# Altium schematic symbol library Electronic Devices_LIB.SchLib: 703 symbols (part 5 of 8)
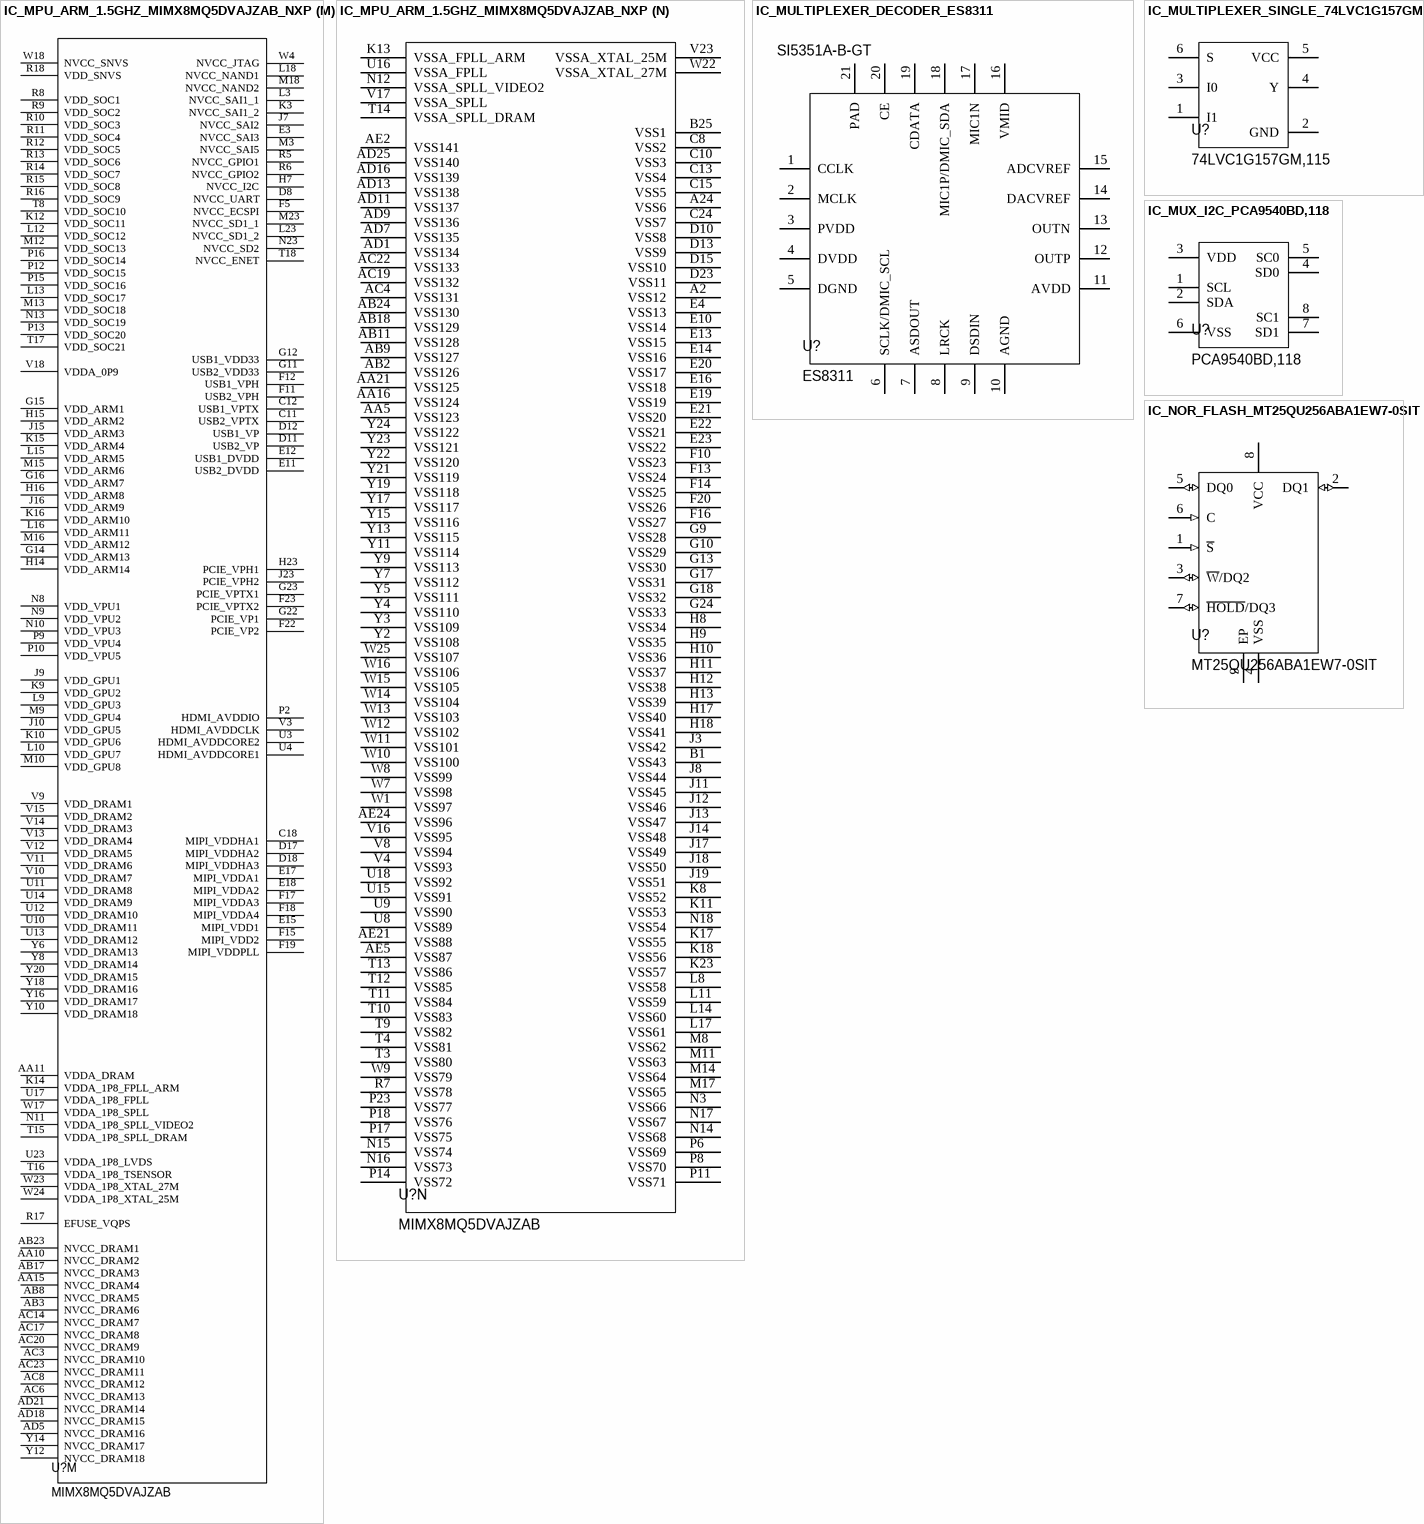
[diagram p40: symbols IC_MPU_ARM_1.5GHZ_MIMX8MQ5DVAJZAB_NXP to IC_NOR_FLASH_MT25QU256ABA1EW7-0SIT]

## IC_MPU_ARM_1.5GHZ_MIMX8MQ5DVAJZAB_NXP
designator U?, comment MIMX8MQ5DVAJZAB
SOC i.MX 8M ARM Cortex A53/ARM Cortex M4 621-Pin FBGA Tray; Manufacturer: NXP Semiconductors; Supplier 1: Digi-Key; Manufacturer Part Number: MIMX8MQ5DVAJZAB; RoHS: Yes; Category: Microprocessors; Stock 1: 760; Pricing 1: 1=66.08, 10=53.977, 90=48.753 (USD); RoHS Compliant: Yes; Supplier Part Number 1: 568-14719-ND
footprint IC_MPU_BGA621C65P25X25_1700X1700X218 (621-FCPBGA (17x17))
part A pins: AA1 DRAM_DQ22, AA2 DRAM_DQ20, AA3 DRAM_DQ26, AA4 DRAM_DQ25, AA6 DRAM_DQ27, AA7 DRAM_DQ30, AA8 DRAM_DQ28, AA9 DRAM_DQ31, AA12 -- / PARITY / --, AA13 ZQ / ZQ / ZQ, AA14 VREF / VREF / VREF, AA17 DRAM_DQ15, AA18 DRAM_DQ12, AA19 DRAM_DQ14, AA20 DRAM_DQ11, AA22 DRAM_DQ09, AA23 DRAM_DQ10, AA24 DRAM_DQ04, AA25 DRAM_DQ06, AB1 DRAM_DQ23, AB4 DRAM_DQ24, AB5 DRAM_DQS3_P, AB6 DRAM_DM3, AB7 DRAM_DQ29, AB10 -- / RAS_n(A16) / RAS#, AB12 -- / BA1 / BA1, AB13 RESET_n / RESET_n / RESET#, AB14 MTEST / MTEST / MTEST, AB15 -- / A9 / A9, AB16 -- / A4 / A4, AB19 DRAM_DQ13, AB20 DRAM_DM1, AB21 DRAM_DQS1_P, AB22 DRAM_DQ08, AB25 DRAM_DQ07, AC1 DRAM_DQS2_N, AC2 DRAM_DQS2_P, AC5 DRAM_DQS3_N, AC7 CA2_B / A13 / A13, AC9 CS0_B / -- / --, AC10 -- / WE_n(A14) / WE#, AC11 -- / CS1_n / CS1#, AC12 -- / ODT0 / ODT0, AC13 MTEST1 / MTEST1(ALERT_n) / MTEST1, AC15 -- / A3 / A3, AC16 CKE0_A / CKE0 / CKE0, AC18 CS1_A / C0 / --, AC21 DRAM_DQS1_N, AC24 DRAM_DQS0_P, AC25 DRAM_DQS0_N, AD2 DRAM_DQ17, AD3 DRAM_DM2, AD4 DRAM_DQ19, AD6 CA5_B / A0 / A0, AD8 CS1_B / -- / --, AD10 CKE0_B / CK_t_B / CK_B, AD12 CK_t_B / A2 / A2, AD14 CK_t_A / BG0 / BA2, AD15 -- / CK_c_A / CK#_A, AD17 CA0_A / A12 / A12(BC#), AD19 CA4_A / A6 / A6, AD20 CA2_A / A7 / A7, AD22 DRAM_DQ03, AD23 DRAM_DM0, AD24 DRAM_DQ01, AE3 DRAM_DQ16, AE4 DRAM_DQ18, AE6 CA4_B / A10(AP) / A10(AP), AE7 CA3_B / BA0 / BA0, AE8 CA0_B / C2 / --, AE9 CA1_B / CAS_n(A15) / CAS#, AE10 CKE1_B / CK_c_B / CK#_B, AE11 -- / ODT1 / ODT1, AE12 CK_c_B / A1 / A1, AE13 -- / ACT_n / A15, AE14 CK_c_A / BG1 / A14, AE15 -- / CK_t_A / CK_A, AE16 CA1_A / A11 / A11, AE17 CKE1_A / CKE1 / CKE1, AE18 CS0_A / CS0_n / CS0#, AE19 CA5_A / A5 / A5, AE20 CA3_A / A8 / A8, AE22 DRAM_DQ02, AE23 DRAM_DQ00, Y1 DRAM_DQ21, Y25 DRAM_DQ05
part B pins: A8 USB2_RX_P, A9 USB2_TX_P, A10 USB2_DP, A11 USB1_RESREF, A12 USB1_RX_P, A13 USB1_TX_P, A14 USB1_DP, B8 USB2_RX_N, B9 USB2_TX_N, B10 USB2_DN, B11 USB2_RESREF, B12 USB1_RX_N, B13 USB1_TX_N, B14 USB1_DN, C9 USB2_ID, C14 USB1_ID, D9 USB2_VBUS, D14 USB1_VBUS
part C pins: C25 PCIE2_RESREF, D24 PCIE2_RXN_N, D25 PCIE2_RXN_P, E24 PCIE2_TXN_N, E25 PCIE2_TXN_P, F24 PCIE2_REF_PAD_CLK_N, F25 PCIE2_REF_PAD_CLK_P, G25 PCIE1_RESREF, H24 PCIE1_RXN_N, H25 PCIE1_RXN_P, J24 PCIE1_TXN_N, J25 PCIE1_TXN_P, K24 PCIE1_REF_PAD_CLK_N, K25 PCIE1_REF_PAD_CLK_P
part D pins: A15 MIPI_DSI_D3_N, A16 MIPI_DSI_D1_N, A17 MIPI_DSI_D0_N, A18 MIPI_DSI_D2_N, B15 MIPI_DSI_D3_P, B16 MIPI_DSI_D1_P, B17 MIPI_DSI_D0_P, B18 MIPI_DSI_D2_P, C16 MIPI_DSI_CLK_N, C17 MIPI_DSI_REXT, D16 MIPI_DSI_CLK_P
part E pins: A19 MIPI_CSI2_CLK_N, A20 MIPI_CSI2_D1_N, A21 MIPI_CSI2_D2_N, A22 MIPI_CSI1_CLK_N, A23 MIPI_CSI1_D0_N, B19 MIPI_CSI2_CLK_P, B20 MIPI_CSI2_D1_P, B21 MIPI_CSI2_D2_P, B22 MIPI_CSI1_CLK_P, B23 MIPI_CSI1_D0_P, B24 MIPI_CSI1_D2_N, C19 MIPI_CSI2_D3_N, C20 MIPI_CSI2_D0_N, C21 MIPI_CSI1_D3_N, C22 MIPI_CSI1_D1_N, C23 MIPI_CSI1_D2_P, D19 MIPI_CSI2_D3_P, D20 MIPI_CSI2_D0_P, D21 MIPI_CSI1_D3_P, D22 MIPI_CSI1_D1_P
part F pins: M1 HDMI_TX_P_LN_3, M2 HDMI_TX_M_LN_3, N1 HDMI_TX_M_LN_2, N2 HDMI_TX_P_LN_2, P1 HDMI_REXT, P3 HDMI_DDC_SDA, R1 HDMI_REFCLK_N, R2 HDMI_REFCLK_P, R3 HDMI_DDC_SCL, T1 HDMI_TX_P_LN_0, T2 HDMI_TX_M_LN_0, U1 HDMI_TX_M_LN_1, U2 HDMI_TX_P_LN_1, V1 HDMI_AUX_P, V2 HDMI_AUX_N, W2 HDMI_HPD, W3 HDMI_CEC
part G pins: A3 SAI1_MCLK, B2 SAI1_TXD2, B3 SAI1_TXD6, C1 SAI1_TXD7, C2 SAI1_TXD5, C3 SAI3_TXD, C4 SAI3_TXC, D1 SAI1_TXD3, D2 SAI1_TXD4, D3 SAI3_MCLK, E1 SAI1_TXC, E2 SAI1_TXD1, E6 SPDIF_EXT_CLK, F1 SAI1_RXD5, F2 SAI1_TXD0, F3 SAI3_RXD, F4 SAI3_RXC, F6 SPDIF_TX, G1 SAI1_RXD7, G2 SAI1_RXD6, G3 SAI3_TXFS, G4 SAI3_RXFS, G5 SAI2_TXD0, G6 SPDIF_RX, H1 SAI1_TXFS, H2 SAI1_RXD2, H3 SAI2_RXC, H4 SAI2_TXFS, H5 SAI2_MCLK, H6 SAI2_RXD0, J1 SAI1_RXD4, J2 SAI1_RXD3, J4 SAI2_RXFS, J5 SAI2_TXC, K1 SAI1_RXC, K2 SAI1_RXD0, K4 SAI5_MCLK, K5 SAI5_RXD3, L1 SAI1_RXFS, L2 SAI1_RXD1, L4 SAI5_RXD1, L5 SAI5_RXC, M4 SAI5_RXD2, M5 SAI5_RXD0, N4 SAI5_RXFS
part H pins: F21 NAND_CE2_B, G19 NAND_ALE, G20 NAND_DATA00, G21 NAND_CE1_B, H19 NAND_CE0_B, H20 NAND_CE3_B, H21 NAND_CLE, H22 NAND_DATA02, J20 NAND_DATA01, J21 NAND_DATA03, J22 NAND_DATA05, K19 NAND_RE_B, K20 NAND_READY_B, K21 NAND_WP_B, K22 NAND_WE_B, L19 NAND_DATA06, L20 NAND_DATA04, M19 NAND_DATA07, M20 NAND_DQS
part I pins: L21 SD2_CD_B, L22 SD2_CLK, L24 SD1_CMD, L25 SD1_CLK, M21 SD2_WP, M22 SD2_CMD, M24 SD1_DATA1, M25 SD1_DATA0, N21 SD2_DATA1, N22 SD2_DATA0, N24 SD1_DATA4, N25 SD1_DATA2, P21 SD2_DATA3, P22 SD2_DATA2, P24 SD1_DATA5, P25 SD1_DATA3, R22 SD2_RESET_B, R24 SD1_RESET_B, R25 SD1_DATA6, T24 SD1_STROBE, T25 SD1_DATA7
part J pins: N19 ENET_MDIO, N20 ENET_MDC, P19 ENET_TX_CTL, P20 ENET_TD3, R19 ENET_TD2, R20 ENET_TD0, R21 ENET_TD1, T19 ENET_TXC, T20 ENET_RXC, T21 ENET_RX_CTL, U19 ENET_RD0, U20 ENET_RD2, U21 ENET_RD1, V19 ENET_RD3
part K pins: A4 ECSPI1_MOSI, A5 ECSPI2_SS0, A6 UART3_RXD, A7 UART1_TXD, B4 ECSPI1_MISO, B5 ECSPI2_MISO, B6 UART2_RXD, B7 UART3_TXD, C5 ECSPI2_SCLK, C6 UART4_RXD, C7 UART1_RXD, D4 ECSPI1_SS0, D5 ECSPI1_SCLK, D6 UART2_TXD, D7 UART4_TXD, E5 ECSPI2_MOSI, E7 I2C1_SCL, E8 I2C1_SDA, E9 I2C3_SDA, F7 I2C2_SDA, F8 I2C4_SCL, F9 I2C4_SDA, G7 I2C2_SCL, G8 I2C3_SCL, J6 GPIO1_IO15, K6 GPIO1_IO13, K7 GPIO1_IO14, L6 GPIO1_IO11, L7 GPIO1_IO12, M6 GPIO1_IO09, M7 GPIO1_IO10, N5 GPIO1_IO06, N6 GPIO1_IO07, N7 GPIO1_IO08, P4 GPIO1_IO03, P5 GPIO1_IO04, P7 GPIO1_IO05, R4 GPIO1_IO02, T6 GPIO1_IO00, T7 GPIO1_IO01
part L pins: R23 CLK1_P, T5 JTAG_TCK, T22 CLK2_P, T23 CLK1_N, U5 JTAG_TDO, U6 JTAG_TRST_B, U7 JTAG_MOD, U22 CLK2_N, U24 XTALO_25M, U25 XTALI_25M, V5 JTAG_TMS, V6 BOOT_MODE1, V7 TEST_MODE, V20 PMIC_ON_REQ, V21 PMIC_STBY_REQ, V22 RTC, V24 XTALO_27M, V25 XTALI_27M, W5 JTAG_TDI, W6 BOOT_MODE0, W19 RTC_RESET_B, W20 POR_B, W21 ONOFF
part M pins: AA10 NVCC_DRAM2, AA11 VDDA_DRAM, AA15 NVCC_DRAM4, AB3 NVCC_DRAM6, AB8 NVCC_DRAM5, AB17 NVCC_DRAM3, AB23 NVCC_DRAM1, AC3 NVCC_DRAM10, AC6 NVCC_DRAM13, AC8 NVCC_DRAM12, AC14 NVCC_DRAM7, AC17 NVCC_DRAM8, AC20 NVCC_DRAM9, AC23 NVCC_DRAM11, AD5 NVCC_DRAM16, AD18 NVCC_DRAM15, AD21 NVCC_DRAM14, C11 USB2_VPTX, C12 USB1_VPTX, C18 MIPI_VDDHA1, D8 NVCC_UART, D11 USB2_VP, D12 USB1_VP, D17 MIPI_VDDHA2, D18 MIPI_VDDHA3, E3 NVCC_SAI3, E11 USB2_DVDD, E12 USB1_DVDD, E15 MIPI_VDD1, E17 MIPI_VDDA1, E18 MIPI_VDDA2, F5 NVCC_ECSPI, F11 USB2_VPH, F12 USB1_VPH, F15 MIPI_VDD2, F17 MIPI_VDDA3, F18 MIPI_VDDA4, F19 MIPI_VDDPLL, F22 PCIE_VP2, F23 PCIE_VPTX2, G11 USB2_VDD33, G12 USB1_VDD33, G14 VDD_ARM13, G15 VDD_ARM1, G16 VDD_ARM7, G22 PCIE_VP1, G23 PCIE_VPTX1, H7 NVCC_I2C, H14 VDD_ARM14, H15 VDD_ARM2, H16 VDD_ARM8, H23 PCIE_VPH1, J7 NVCC_SAI2, J9 VDD_GPU1, J10 VDD_GPU5, J15 VDD_ARM3, J16 VDD_ARM9, J23 PCIE_VPH2, K3 NVCC_SAI1_2, K9 VDD_GPU2, K10 VDD_GPU6, K12 VDD_SOC11, K14 VDDA_1P8_FPLL_ARM, K15 VDD_ARM4, K16 VDD_ARM10, L3 NVCC_SAI1_1, L9 VDD_GPU3, L10 VDD_GPU7, L12 VDD_SOC12, L13 VDD_SOC17, L15 VDD_ARM5, L16 VDD_ARM11, L18 NVCC_NAND1, L23 NVCC_SD1_2, M3 NVCC_SAI5, M9 VDD_GPU4, M10 VDD_GPU8, M12 VDD_SOC13, M13 VDD_SOC18, M15 VDD_ARM6, M16 VDD_ARM12, M18 NVCC_NAND2, M23 NVCC_SD1_1, N8 VDD_VPU1, N9 VDD_VPU2, N10 VDD_VPU3, N11 VDDA_1P8_SPLL_VIDEO2, N13 VDD_SOC19, N23 NVCC_SD2, P2 HDMI_AVDDIO, P9 VDD_VPU4, P10 VDD_VPU5, P12 VDD_SOC15, P13 VDD_SOC20, P15 VDD_SOC16, P16 VDD_SOC14, R5 NVCC_GPIO1, R6 NVCC_GPIO2, R8 VDD_SOC1, R9 VDD_SOC2, R10 VDD_SOC3, R11 VDD_SOC4, R12 VDD_SOC5, R13 VDD_SOC6, R14 VDD_SOC7, R15 VDD_SOC8, R16 VDD_SOC9, R17 EFUSE_VQPS, R18 VDD_SNVS, T8 VDD_SOC10, T15 VDDA_1P8_SPLL_DRAM, T16 VDDA_1P8_TSENSOR, T17 VDD_SOC21, T18 NVCC_ENET, U3 HDMI_AVDDCORE2, U4 HDMI_AVDDCORE1, U10 VDD_DRAM11, U11 VDD_DRAM8, U12 VDD_DRAM10, U13 VDD_DRAM12, U14 VDD_DRAM9, U17 VDDA_1P8_FPLL, U23 VDDA_1P8_LVDS, V3 HDMI_AVDDCLK, V9 VDD_DRAM1, V10 VDD_DRAM7, V11 VDD_DRAM6, V12 VDD_DRAM5, V13 VDD_DRAM4, V14 VDD_DRAM3, V15 VDD_DRAM2, V18 VDDA_0P9, W4 NVCC_JTAG, W17 VDDA_1P8_SPLL, W18 NVCC_SNVS, W23 VDDA_1P8_XTAL_27M, W24 VDDA_1P8_XTAL_25M, Y6 VDD_DRAM13, Y8 VDD_DRAM14, Y10 VDD_DRAM18, Y12 NVCC_DRAM18, Y14 NVCC_DRAM17, Y16 VDD_DRAM17, Y18 VDD_DRAM16, Y20 VDD_DRAM15
part N pins: A2 VSS12, A24 VSS6, AA5 VSS123, AA16 VSS124, AA21 VSS125, AB2 VSS126, AB9 VSS127, AB11 VSS128, AB18 VSS129, AB24 VSS130, AC4 VSS131, AC19 VSS132, AC22 VSS133, AD1 VSS134, AD7 VSS135, AD9 VSS136, AD11 VSS137, AD13 VSS138, AD16 VSS139, AD25 VSS140, AE2 VSS141, AE5 VSS87, AE21 VSS88, AE24 VSS96, B1 VSS43, B25 VSS1, C8 VSS2, C10 VSS3, C13 VSS4, C15 VSS5, C24 VSS7, D10 VSS8, D13 VSS9, D15 VSS10, D23 VSS11, E4 VSS13, E10 VSS14, E13 VSS15, E14 VSS16, E16 VSS18, E19 VSS19, E20 VSS17, E21 VSS20, E22 VSS21, E23 VSS22, F10 VSS23, F13 VSS24, F14 VSS25, F16 VSS27, F20 VSS26, G9 VSS28, G10 VSS29, G13 VSS30, G17 VSS31, G18 VSS32, G24 VSS33, H8 VSS34, H9 VSS35, H10 VSS36, H11 VSS37, H12 VSS38, H13 VSS39, H17 VSS40, H18 VSS41, J3 VSS42, J8 VSS44, J11 VSS45, J12 VSS46, J13 VSS47, J14 VSS48, J17 VSS49, J18 VSS50, J19 VSS51, K8 VSS52, K11 VSS53, K13 VSSA_FPLL_ARM, K17 VSS55, K18 VSS56, K23 VSS57, L8 VSS58, L11 VSS59, L14 VSS60, L17 VSS61, M8 VSS62, M11 VSS63, M14 VSS64, M17 VSS65, N3 VSS66, N12 VSSA_SPLL_VIDEO2, N14 VSS68, N15 VSS74, N16 VSS73, N17 VSS67, N18 VSS54, P6 VSS69, P8 VSS70, P11 VSS71, P14 VSS72, P17 VSS75, P18 VSS76, P23 VSS77, R7 VSS78, T3 VSS80, T4 VSS81, T9 VSS82, T10 VSS83, T11 VSS84, T12 VSS85, T13 VSS86, T14 VSSA_SPLL_DRAM, U8 VSS89, U9 VSS90, U15 VSS91, U16 VSSA_FPLL, U18 VSS92, V4 VSS93, V8 VSS94, V16 VSS95, V17 VSSA_SPLL, V23 VSSA_XTAL_25M, W1 VSS97, W7 VSS98, W8 VSS99, W9 VSS79, W10 VSS100, W11 VSS101, W12 VSS102, W13 VSS103, W14 VSS104, W15 VSS105, W16 VSS106, W22 VSSA_XTAL_27M, W25 VSS107, Y2 VSS108, Y3 VSS109, Y4 VSS110, Y5 VSS111, Y7 VSS112, Y9 VSS113, Y11 VSS114, Y13 VSS115, Y15 VSS116, Y17 VSS117, Y19 VSS118, Y21 VSS119, Y22 VSS120, Y23 VSS121, Y24 VSS122

## IC_MULTIPLEXER_DECODER_ES8311
designator U?, comment ES8311  Supplier Part Number 1: SI5351A-B-GT
Programmable PLL Clock Generator Dual 0.0025MHz to 200MHz 10-Pin MSOP Bulk; Manufacturer: Everest Semiconductor; Number of Outputs: 3; Max Duty Cycle: 55%; Operating Supply Current: 35mA; Number of Circuits: 2; Input: Crystal; PLL: Yes; Max Supply Voltage: 3.6V; Min Supply Voltage: 3V; Number of Inputs: 1NUMBER; Manufacturer part number: ES8311; Supplier: LCSC; ComponentLink1Description: Link Supplier; ComponentLink1URL: *; Supplier 1: Heisener; RoHS: Yes; Category: Clock Generators, PLLs, Frequency Synthesizers; Stock 1: 46556; Pricing 1: 1=2.256 (USD); Case/Package: MSOP; Number of Pins: 10; Min Operating Temperature: -40°C; Max Operating Temperature: 85°C; Packaging: Rail/Tube; Package Quantity: 50; Max Frequency: 200MHz; Series: MultiSynth™; Frequency: 200MHz; Length: 4mm; Width: 4mm; Height: 0.85mm; RoHS Compliant: Yes; Lead Free: Lead Free; ComponentLink2URL: https://datasheet.ciiva.com/12294/si5351-5534-12294784.pdf?src-supplier=Mouser; ComponentLink2Description: https://datasheet.ciiva.com/12294/si5351-5534-12294784.pdf?src-supplier=Mouser
footprint WQFN-20 (QFN, 20-Leads, Body 3.00x3.00mm, Pitch 0.40mm, Thermal Pad 1.80x1.80mm, IPC Medium Density)
pins: 1 CCLK, 2 MCLK, 3 PVDD, 4 DVDD, 5 DGND, 6 SCLK/DMIC_SCL, 7 ASDOUT, 8 LRCK, 9 DSDIN, 10 AGND, 11 AVDD, 12 OUTP, 13 OUTN, 14 DACVREF, 15 ADCVREF, 16 VMID, 17 MIC1N, 18 MIC1P/DMIC_SDA, 19 CDATA, 20 CE, 21 PAD

## IC_MULTIPLEXER_SINGLE_74LVC1G157GM,115
designator U?, comment 74LVC1G157GM,115
IC SINGLE 2-INPUT MUX 6-XSON; Manufacturer: Nexperia; Supplier 1: Digikey; Manufacturer Part Number: 74LVC1G157GM,115; RoHS: Yes; Category: Decoders and Multiplexers; Stock 1: 27113; Pricing 1: 1=0.23, 10=0.157, 25=0.1388, 100=0.1186, 250=0.10904, 500=0.10322, 1000=0.09845, 2500=0.09341, 5000=0.09037, 10000=0.08787, 15000=0.08662, 25000=0.08523, 35000=0.08442, 50000=0.08364 (USD); RoHS Compliant: Yes; ComponentLink1URL: https://datasheet.octopart.com/74LVC1G157GM%2C115-Nexperia-datasheet-102410722.pdf?src-supplier=Farnell; ComponentLink1Description: https://datasheet.octopart.com/74LVC1G157GM%2C115-Nexperia-datasheet-102410722.pdf?src-supplier=Farnell; ComponentLink2URL: https://datasheet.octopart.com/74LVC1G157GM%2C115-NXP-datasheet-140390.pdf?src-supplier=Future+Electronics; ComponentLink2Description: https://datasheet.octopart.com/74LVC1G157GM%2C115-NXP-datasheet-140390.pdf?src-supplier=Future+Electronics; ComponentLink3URL: https://datasheet.octopart.com/74LVC1G157GM%2C115-Nexperia-datasheet-166310759.pdf?src-supplier=TME; ComponentLink3Description: https://datasheet.octopart.com/74LVC1G157GM%2C115-Nexperia-datasheet-166310759.pdf?src-supplier=TME; Supplier Part Number 1: 1727-3489-1-ND
footprint IC_MUX_PESD3V3L5UF115
pins: 1 I1, 2 GND, 3 I0, 4 Y, 5 VCC, 6 S

## IC_MUX_I2C_PCA9540BD,118
designator U?, comment PCA9540BD,118
PCA9540B Series 5.5 V 400 kHz 100 uA 3-Bit I/O Surface Mount I2C-Bus - SOIC-8; Manufacturer: NXP Semiconductors; Interface: I2C; Logic Function: Multiplexer; Low Level Output Current: 6mA; Max Frequency: 400kHz; Max Supply Current: 65uA; Max Supply Voltage: 5.5V; Min Supply Voltage: 2.3V; Number of Input Lines: 2; Number of Output Lines: 1; Operating Supply Voltage: 5V; Power Dissipation: 400mW; Propagation Delay: 300ps; Resistance: 55R; Supplier 1: Mouser; Manufacturer Part Number: PCA9540BD,118; RoHS: Yes; Category: Interface ICs; Stock 1: 9146; Pricing 1: 1=1.71, 10=1.33, 50=1.33, 100=1.19, 250=1.12, 500=1.08, 1000=0.892, 2500=0.831, 5000=0.8, 10000=0.746 (USD); Mount: Surface Mount; Case/Package: SO; Number of Pins: 8; Contact Plating: Gold; Weight: 506.605978mg; Min Operating Temperature: -40°C; Max Operating Temperature: 85°C; Packaging: Tape and Reel; Number of Inputs: 2; Number of Outputs: 1; Quiescent Current: 65uA; Number of Circuits: 1; Length: 5mm; Width: 4mm; Height: 1.45mm; Radiation Hardening: No; Lead Free: Lead Free; RoHS Compliant: Yes; ComponentLink1URL: https://datasheet.octopart.com/PCA9540BD%2C118-NXP-Semiconductors-datasheet-13519699.pdf?src-supplier=Newark; ComponentLink1Description: https://datasheet.octopart.com/PCA9540BD%2C118-NXP-Semiconductors-datasheet-13519699.pdf?src-supplier=Newark; ComponentLink2URL: https://datasheet.octopart.com/PCA9540BD%2C118-NXP-datasheet-131997.pdf?src-supplier=Future+Electronics; ComponentLink2Description: https://datasheet.octopart.com/PCA9540BD%2C118-NXP-datasheet-131997.pdf?src-supplier=Future+Electronics; Supplier Part Number 1: 771-PCA9540BD-T
footprint IC_MUX_I2C_SOIC127P600X175-8N
pins: 1 SCL, 2 SDA, 3 VDD, 4 SD0, 5 SC0, 6 VSS, 7 SD1, 8 SC1

## IC_NOR_FLASH_MT25QU256ABA1EW7-0SIT
designator U?, comment MT25QU256ABA1EW7-0SIT
NOR Flash Serial-SPI 1.8V 256M-bit 256M/128M/64M x 1/2-bit/4-bit 6ns 8-Pin WPDFN EP; Manufacturer: Micron Technology; Memory Type: Non-Volatile,FLASH; Memory Size: 256Mb; Frequency: 133MHz; Supplier 1: Digikey; Manufacturer Part Number: MT25QU256ABA1EW7-0SIT; RoHS: Yes; Category: Flash; Stock 1: 8519; Pricing 1: 1=5.83, 10=5.323, 25=5.2212, 50=5.1834, 100=4.6512, 250=4.63372, 500=4.34284, 1000=4.15958 (USD); Mount: Surface Mount; Min Operating Temperature: -40°C; Max Operating Temperature: 85°C; Packaging: Bulk; Series: -; RoHS Compliant: Yes; ComponentLink1URL: https://www.micron.com/~/media/documents/products/data-sheet/nor-flash/serial-nor/mt25q/die-rev-a/mt25q_qljs_u_256_aba_0.pdf?src-supplier=Digikey; ComponentLink1Description: https://www.micron.com/~/media/documents/products/data-sheet/nor-flash/serial-nor/mt25q/die-rev-a/mt25q_qljs_u_256_aba_0.pdf?src-supplier=Digikey; ComponentLink2URL: http://www.micron.com/-/media/documents/products/data%20sheet/nor%20flash/serial%20nor/mt25q/qlks_512mb_3v_45nm.pdf?src-supplier=Avnet; ComponentLink2Description: http://www.micron.com/-/media/documents/products/data%20sheet/nor%20flash/serial%20nor/mt25q/qlks_512mb_3v_45nm.pdf?src-supplier=Avnet; ComponentLink3URL: https://datasheet.octopart.com/MT25QU256ABA1EW7-0SIT-Micron-datasheet-138104096.pdf?src-supplier=LKR; ComponentLink3Description: https://datasheet.octopart.com/MT25QU256ABA1EW7-0SIT-Micron-datasheet-138104096.pdf?src-supplier=LKR; ComponentLink4URL: https://datasheet.octopart.com/MT25QU256ABA1EW7-0SIT-Micron-datasheet-149529383.pdf?src-supplier=SHENGYU+ELECTRONICS; ComponentLink4Description: https://datasheet.octopart.com/MT25QU256ABA1EW7-0SIT-Micron-datasheet-149529383.pdf?src-supplier=SHENGYU+ELECTRONICS; Supplier Part Number 1: MT25QU256ABA1EW7-0SIT-ND
footprint IC_NOR_FLASH (DFN8_1P27_6X5MM_3P1)
pins: 1 ~{S} (in), 2 DQ1 (io), 3 ~{W}/DQ2 (io), 4 VSS (power), 5 DQ0 (io), 6 C (in), 7 ~{HOLD}/DQ3 (io), 8 VCC (power), 9 EP (power)

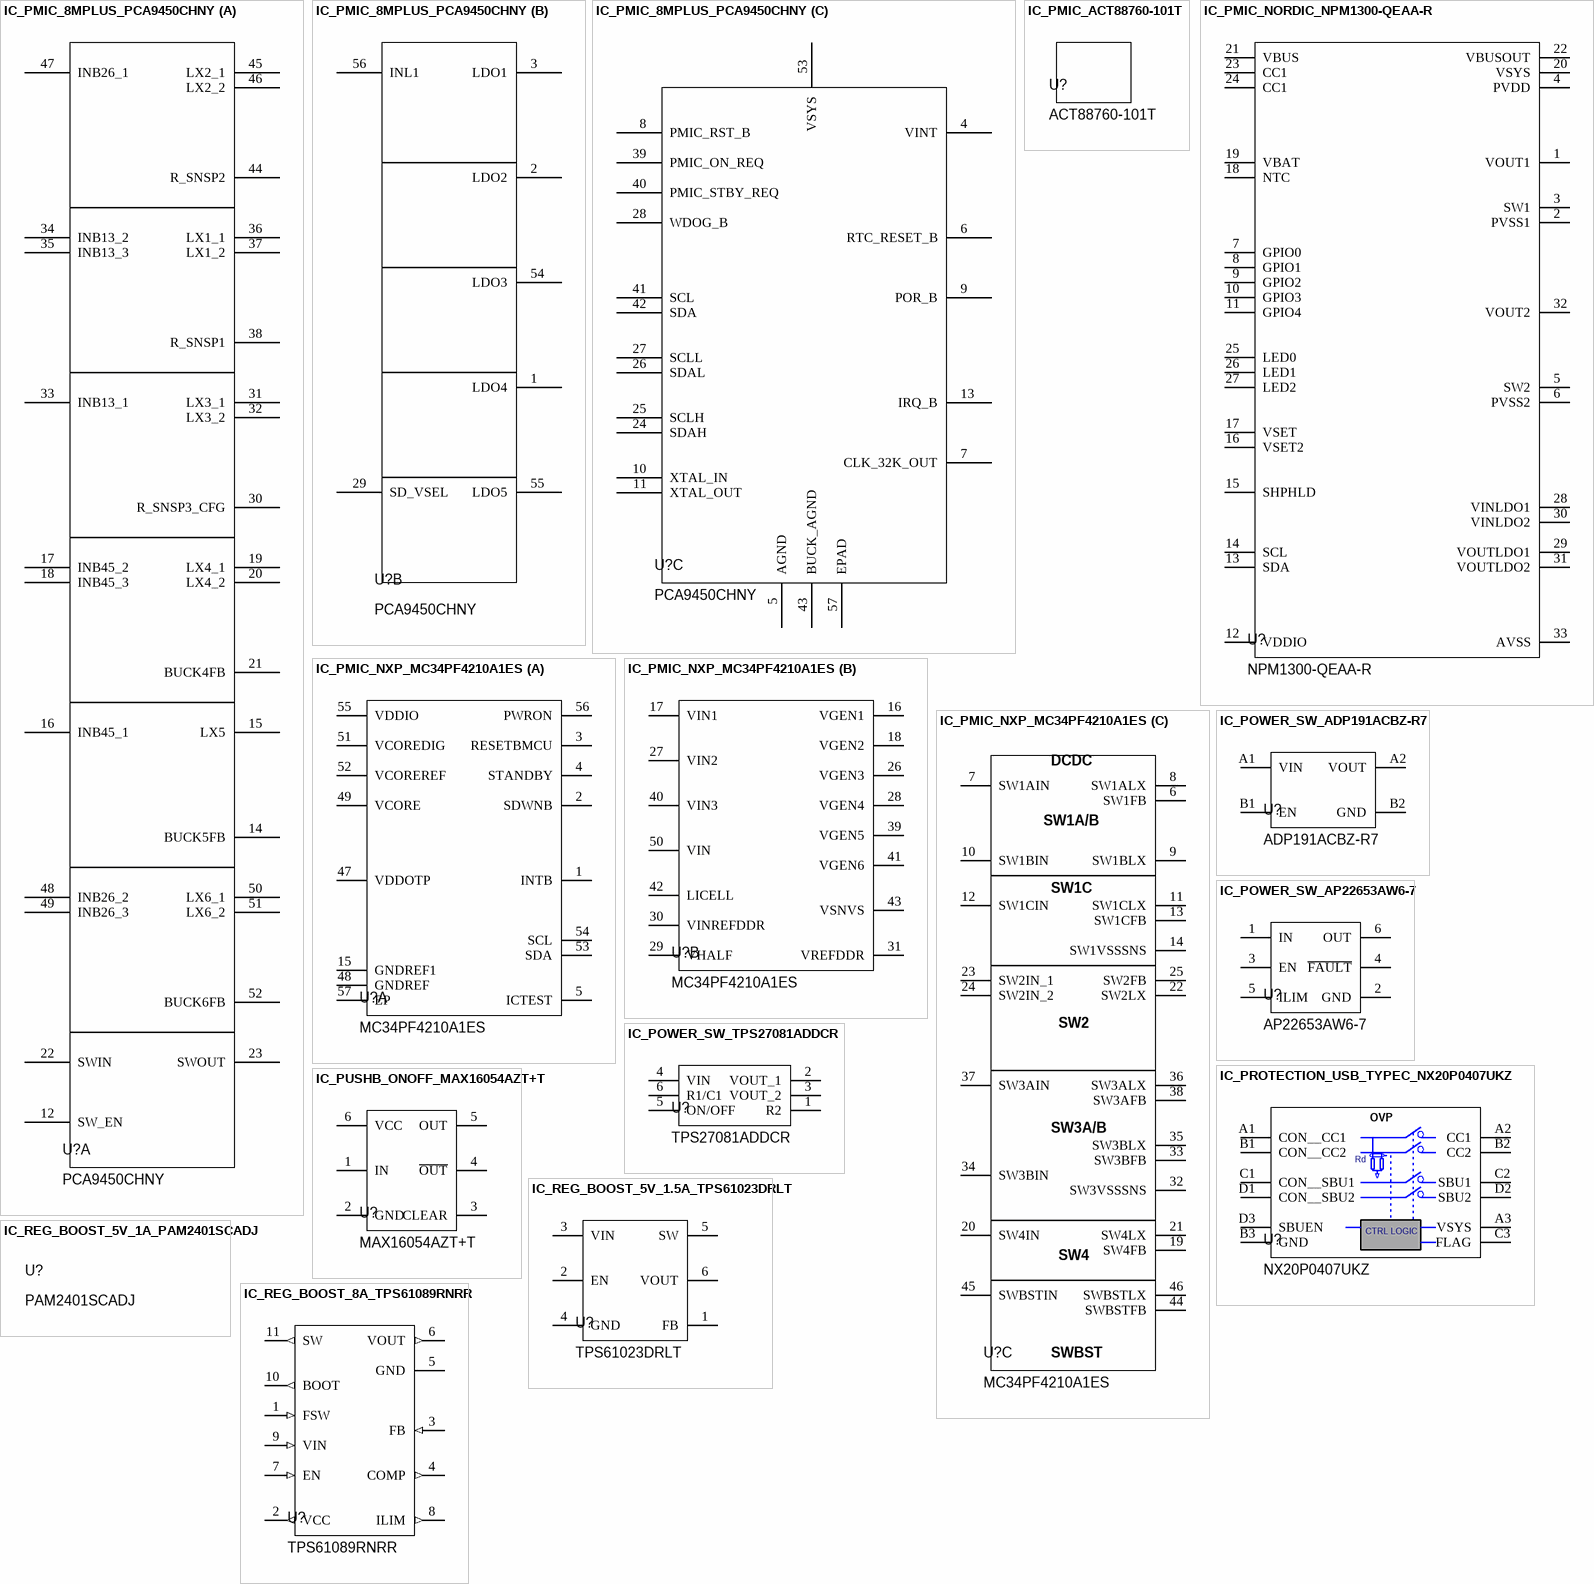
[diagram p25: symbols IC_PMIC_8MPLUS_PCA9450CHNY to IC_REG_BOOST_8A_TPS61089RNRR]

## IC_PMIC_8MPLUS_PCA9450CHNY
designator U?, comment PCA9450CHNY
SAMPLE FPN ONLY - Power Management Specialized - PMIC PMIC for i.MX8M Plus(865S); Manufacturer: NXP Semiconductors; Supplier 1: Digikey; Manufacturer Part Number: PCA9450CHNY; RoHS: Yes; Category: Power Management ICs; Stock 1: 22066; Pricing 1: 1=6.6, 10=5.931, 25=5.6072, 100=4.8595, 250=4.61032, 500=4.13684, 1000=3.4889 (USD); RoHS Compliant: Yes; Supplier Part Number 1: 568-PCA9450CHNYCT-ND
footprint IC_PMIC_QFN40P800X800X100-57N-D (QFN40P)
part A pins: 12 SW_EN, 14 BUCK5FB, 15 LX5, 16 INB45_1, 17 INB45_2, 18 INB45_3, 19 LX4_1, 20 LX4_2, 21 BUCK4FB, 22 SWIN, 23 SWOUT, 30 R_SNSP3_CFG, 31 LX3_1, 32 LX3_2, 33 INB13_1, 34 INB13_2, 35 INB13_3, 36 LX1_1, 37 LX1_2, 38 R_SNSP1, 44 R_SNSP2, 45 LX2_1, 46 LX2_2, 47 INB26_1, 48 INB26_2, 49 INB26_3, 50 LX6_1, 51 LX6_2, 52 BUCK6FB
part B pins: 1 LDO4, 2 LDO2, 3 LDO1, 29 SD_VSEL, 54 LDO3, 55 LDO5, 56 INL1
part C pins: 4 VINT, 5 AGND (power), 6 RTC_RESET_B, 7 CLK_32K_OUT, 8 PMIC_RST_B, 9 POR_B, 10 XTAL_IN, 11 XTAL_OUT, 13 IRQ_B, 24 SDAH, 25 SCLH, 26 SDAL, 27 SCLL, 28 WDOG_B, 39 PMIC_ON_REQ, 40 PMIC_STBY_REQ, 41 SCL, 42 SDA, 43 BUCK_AGND (power), 53 VSYS (power), 57 EPAD (power)

## IC_PMIC_ACT88760-101T
designator U?, comment ACT88760-101T
Step Down Converter with LDO Regulator 13-OUT 81-Pin WLCSP T/R; Manufacturer: Qorvo; Supplier 1: Mouser; Manufacturer Part Number: ACT88760-101T; RoHS: No; Category: Uncategorized; Stock 1: 2969; Pricing 1: 1=7.17, 10=7.17, 25=6.4, 50=6.4, 100=5.85, 250=5.29, 500=4.73, 1000=4.36, 3000=3.98, 10000=3.98 (USD); Supplier Part Number 1: 772-ACT88760-101T
footprint IC_WLCSP-81_BGA81C40P9X9_379X369X56 (81-PIN WLCSP)

## IC_PMIC_NORDIC_NPM1300-QEAA-R
designator U?, comment NPM1300-QEAA-R
Power Management IC, 1OUTPUT, 85DEG C Rohs Compliant: Yes; Manufacturer: Nordic Semiconductor; Supplier 1: Digikey; Manufacturer Part Number: NPM1300-QEAA-R; RoHS: No; Category: Battery Management; Stock 1: 3390; Pricing 1: 1=4.13, 100=3.23, 500=2.55, 1000=2.22001 (USD); Supplier Part Number 1: 4823-NPM1300-QEAA-RCT-ND
footprint IC_PMIC_QFN50P500X500X90-33N
pins: 1 VOUT1, 2 PVSS1, 3 SW1, 4 PVDD, 5 SW2, 6 PVSS2, 7 GPIO0, 8 GPIO1, 9 GPIO2, 10 GPIO3, 11 GPIO4, 12 VDDIO, 13 SDA, 14 SCL, 15 SHPHLD, 16 VSET2, 17 VSET, 18 NTC, 19 VBAT, 20 VSYS, 21 VBUS, 22 VBUSOUT, 23 CC1, 24 CC1, 25 LED0, 26 LED1, 27 LED2, 28 VINLDO1, 29 VOUTLDO1, 30 VINLDO2, 31 VOUTLDO2, 32 VOUT2, 33 AVSS

## IC_PMIC_NXP_MC34PF4210A1ES
designator U?, comment MC34PF4210A1ES
Step Up DC-DC Converter with LDO Regulator 13-OUT 56-Pin QFN Tray; Manufacturer: NXP Semiconductors; Supplier 1: Mouser; Manufacturer Part Number: MC34PF4210A1ES; RoHS: Yes; Category: Power Management ICs; Stock 1: 24; Pricing 1: 1=10.48, 10=9.47, 25=8.72, 50=8.72, 100=7.87, 260=7.34, 520=6.84, 1000=6.84, 1040=6.18, 10000=6.18 (USD); RoHS Compliant: Yes; Supplier Part Number 1: 771-MC34PF4210A1ES
footprint IC_PMIC_QFN50P800X800X90-57N-D (56-QFN-EP (8x8))
part A pins: 1 INTB, 2 SDWNB, 3 RESETBMCU, 4 STANDBY, 5 ICTEST, 15 GNDREF1, 47 VDDOTP, 48 GNDREF, 49 VCORE, 51 VCOREDIG, 52 VCOREREF, 53 SDA, 54 SCL, 55 VDDIO, 56 PWRON, 57 EP
part B pins: 16 VGEN1, 17 VIN1, 18 VGEN2, 26 VGEN3, 27 VIN2, 28 VGEN4, 29 VHALF, 30 VINREFDDR, 31 VREFDDR, 39 VGEN5, 40 VIN3, 41 VGEN6, 42 LICELL, 43 VSNVS, 50 VIN
part C pins: 6 SW1FB, 7 SW1AIN, 8 SW1ALX, 9 SW1BLX, 10 SW1BIN, 11 SW1CLX, 12 SW1CIN, 13 SW1CFB, 14 SW1VSSSNS, 19 SW4FB, 20 SW4IN, 21 SW4LX, 22 SW2LX, 23 SW2IN_1, 24 SW2IN_2, 25 SW2FB, 32 SW3VSSSNS, 33 SW3BFB, 34 SW3BIN, 35 SW3BLX, 36 SW3ALX, 37 SW3AIN, 38 SW3AFB, 44 SWBSTFB, 45 SWBSTIN, 46 SWBSTLX

## IC_POWER_SW_ADP191ACBZ-R7
designator U?, comment ADP191ACBZ-R7
Power Switch Hi Side 1-OUT 0.5A 0.16Ohm 4-Pin WLCSP T/R; Manufacturer: Analog Devices; Output Current: 500mA; Number of Outputs: 1; Max Power Dissipation: 7.2uW; Interface: On/Off; On-State Resistance: 105mR; Operating Supply Current: 2uA; Max Input Voltage: 3.6V; Min Input Voltage: 1.1V; Output Configuration: High Side; Supplier 1: Mouser; Manufacturer Part Number: ADP191ACBZ-R7; RoHS: Yes; Category: Voltage Regulators - Linear; Stock 1: 11278; Pricing 1: 1=1.27, 10=1.12, 50=1.12, 100=0.869, 1000=0.606, 10000=0.517 (USD); Mount: Surface Mount; Number of Pins: 4; Min Operating Temperature: -40°C; Max Operating Temperature: 85°C; Package Quantity: 1; Packaging: Tape and Reel; Max Output Current: 500mA; Max Supply Current: 500mA; Operating Supply Voltage: 3.6V; Series: -; Supply Current: 500mA; Radiation Hardening: No; Reach SVHC Compliant: No; Lead Free: Contains Lead; RoHS Compliant: Yes; ComponentLink1URL: https://datasheet.ciiva.com/1954/adp190-191-1954912.pdf?src-supplier=Digikey; ComponentLink1Description: https://datasheet.ciiva.com/1954/adp190-191-1954912.pdf?src-supplier=Digikey; ComponentLink2URL: https://datasheet.ciiva.com/1161/1610821-1161050.pdf?src-supplier=Element14; ComponentLink2Description: https://datasheet.ciiva.com/1161/1610821-1161050.pdf?src-supplier=Element14; ComponentLink3URL: https://datasheet.ciiva.com/15109/getdatasheetpartid-562544-15109170.pdf?src-supplier=Verical; ComponentLink3Description: https://datasheet.ciiva.com/15109/getdatasheetpartid-562544-15109170.pdf?src-supplier=Verical; ComponentLink4URL: https://datasheet.ciiva.com/1954/adp190-191-1954910.pdf?src-supplier=Digikey; ComponentLink4Description: https://datasheet.ciiva.com/1954/adp190-191-1954910.pdf?src-supplier=Digikey; ComponentLink5URL: https://datasheet.ciiva.com/1954/adp190-191-1954911.pdf?src-supplier=Digikey; ComponentLink5Description: https://datasheet.ciiva.com/1954/adp190-191-1954911.pdf?src-supplier=Digikey; Supplier Part Number 1: 584-ADP191ACBZ-R7
footprint IC_PWR_SW_BGA4C40P2X2_76X76X66 (4-WLCSP (0.76x0.76))
pins: A1 VIN, A2 VOUT, B1 EN, B2 GND

## IC_POWER_SW_AP22653AW6-7
designator U?, comment AP22653AW6-7
Switch, precision adjustable, current limited power switch, SOT26 | Diodes Inc AP22653AW6-7; Number of Channels: 1; Supplier 1: Digikey; Manufacturer: Diodes; Manufacturer Part Number: AP22653AW6-7; RoHS: Yes; Category: USB Interface ICs; Stock 1: 354803; Pricing 1: 1=0.73, 10=0.45, 25=0.3756, 100=0.2904, 250=0.24848, 500=0.22276, 1000=0.20129, 3000=0.11602, 6000=0.10675, 9000=0.10207, 15000=0.1 (USD); ComponentLink1URL: https://www.diodes.com/assets/Datasheets/AP22652_53_52A_53A.pdf?src-supplier=Digikey; ComponentLink1Description: https://www.diodes.com/assets/Datasheets/AP22652_53_52A_53A.pdf?src-supplier=Digikey; Supplier Part Number 1: 31-AP22653AW6-7CT-ND
footprint IC_POWER_SW_SOT95P280X145-6N
pins: 1 IN, 2 GND, 3 EN, 4 ~{FAULT}, 5 ILIM, 6 OUT

## IC_POWER_SW_TPS27081ADDCR
designator U?, comment TPS27081ADDCR